# Altium schematic symbol library BARKO_SCHLIB.SchLib: 1064 symbols (part 1 of 11) (continued)
## C-47PF-0402 (continued)
CAP CER 47PF 50V C0G/NP0 0402; Manufacturer: Samsung; Manufacturer Part Number: CL05C470JB5NNNC; Material: Ceramic; Tolerance: 5%; Dielectric: C0G; Temperature Coefficient: 300ppm/°C; .Creator: F:TALI; .PCBCHK: USED; Washability: OK; Supplier 1: Digi-Key; Stock 1: 2062100; Pricing 1: 1 = 0.10000, 10 = 0.02300, 100 = 0.01050, 500 = 0.00748, 1000 = 0.00587, 2500 = 0.00534, 5000 = 0.00491 (USD); Mount: Surface Mount; Case Code (Metric): 1005; Case Code (Imperial): 0402; Contact Plating: Tin; Min Operating Temperature: -55°C; Max Operating Temperature: 125°C; Packaging: Tape and Reel; Package Quantity: 1; Capacitance: 47pF; Voltage Rating: 50V; Length: 1mm; Height: 0.5mm; Width: 0.02inch; Thickness: 0.022inch; Depth: 0.5mm; Radiation Hardening: No; ComponentLink1URL: http://www1.futureelectronics.com/doc/SAMSUNG%20PASSIVE/CL05B104KQ5NNNC.pdf?src-supplier=Future+Electronics; ComponentLink1Description: http://www1.futureelectronics.com/doc/SAMSUNG%20PASSIVE/CL05B104KQ5NNNC.pdf?src-supplier=Future+Electronics; ComponentLink2URL: https://www.verical.com/server-webapp/html/getDatasheet?partID=466159&src-supplier=Verical; ComponentLink2Description: https://www.verical.com/server-webapp/html/getDatasheet?partID=466159&src-supplier=Verical; ComponentLink3URL: https://produktinfo.conrad.com/datenblaetter/450000-474999/458555-da-01-en-VS_KONDENSATOR_0402.pdf?src-supplier=Conrad; ComponentLink3Description: https://produktinfo.conrad.com/datenblaetter/450000-474999/458555-da-01-en-VS_KONDENSATOR_0402.pdf?src-supplier=Conrad; ComponentLink4URL: http://datasheet.octopart.com/CL05C470JB5NNNC-Samsung-datasheet-8324245.pdf; ComponentLink4Description: http://datasheet.octopart.com/CL05C470JB5NNNC-Samsung-datasheet-8324245.pdf; ComponentLink5URL: http://datasheet.octopart.com/CL05C470JB5NNNC-Samsung-datasheet-8326407.pdf?src-supplier=TME; ComponentLink5Description: http://datasheet.octopart.com/CL05C470JB5NNNC-Samsung-datasheet-8326407.pdf?src-supplier=TME; ComponentLink6URL: http://datasheet.octopart.com/CL05C470JB5NNNC-Samsung-datasheet-26589092.pdf?src-supplier=Future+Electronics; ComponentLink6Description: http://datasheet.octopart.com/CL05C470JB5NNNC-Samsung-datasheet-26589092.pdf?src-supplier=Future+Electronics; ComponentLink7URL: http://datasheet.octopart.com/CL05C470JB5NNNC-Samsung-datasheet-37081328.pdf?src-supplier=Future+Electronics; ComponentLink7Description: http://datasheet.octopart.com/CL05C470JB5NNNC-Samsung-datasheet-37081328.pdf?src-supplier=Future+Electronics; ComponentLink8URL: http://datasheet.octopart.com/CL05C470JB5NNNC-Samsung-Electro-Mechanics-datasheet-81461755.pdf?src-supplier=Future+Electronics; ComponentLink8Description: http://datasheet.octopart.com/CL05C470JB5NNNC-Samsung-Electro-Mechanics-datasheet-81461755.pdf?src-supplier=Future+Electronics; ComponentLink9URL: http://datasheet.octopart.com/CL05C470JB5NNNC-Samsung-Electro-Mechanics-datasheet-110326809.pdf?src-supplier=Future+Electronics; ComponentLink9Description: http://datasheet.octopart.com/CL05C470JB5NNNC-Samsung-Electro-Mechanics-datasheet-110326809.pdf?src-supplier=Future+Electronics; ComponentLink10URL: http://datasheet.octopart.com/General-Multilayer-Ceramic-Capacitors-Samsung-datasheet-family-111.pdf; ComponentLink10Description: http://datasheet.octopart.com/General-Multilayer-Ceramic-Capacitors-Samsung-datasheet-family-111.pdf; Supplier Part Number 1: 1276-1699-1-ND; .SCHCHK: USED
footprint C-0402
pins: 1, 2

## C-47PF-0603
designator C?, comment 47PF  Voltage Rating: 50V  Case/Package: 0603
CAP CER 47PF 50V C0G/NP0 0603; Manufacturer: Samsung; Manufacturer Part Number: CL10C470JB8NNNC; Material: Ceramic; Tolerance: 5%; Dielectric: C0G; Temperature Coefficient: 300ppm/°C; Washability: OK; .Creator: M.OZKAN; .PCBCHK: USED; Supplier 1: Digi-Key; Stock 1: 211880; Pricing 1: 1=0.10000, 10=0.05600, 100=0.02510, 500=0.01792, 1000=0.01408 (USD); RoHS: Yes; Mount: Surface Mount; Case Code (Metric): 1608; Case Code (Imperial): 0603; Min Operating Temperature: -55°C; Max Operating Temperature: 125°C; Capacitance: 47pF; Voltage: 50V; Voltage Rating (DC): 50V; Package Quantity: 1; Packaging: Tape and Reel; Length: 1.6mm; Height: 0.8mm; Depth: 0.8mm; Width: 0.031inch; Thickness: 0.035inch; Radiation Hardening: No; Lead Free: Lead Free; ComponentLink1URL: https://datasheet.ciiva.com/25803/cl10c470jb8nnnc-25803543.pdf?src-supplier=Digi-Key; ComponentLink1Description: https://datasheet.ciiva.com/25803/cl10c470jb8nnnc-25803543.pdf?src-supplier=Digi-Key; ComponentLink2URL: https://datasheet.ciiva.com/26838/getdatasheetpartid-359564-26838540.pdf?src-supplier=Verical; ComponentLink2Description: https://datasheet.ciiva.com/26838/getdatasheetpartid-359564-26838540.pdf?src-supplier=Verical; ComponentLink3URL: https://datasheet.ciiva.com/29198/456890-da-01-en-vs-kondensator-0603-29198885.pdf?src-supplier=Conrad; ComponentLink3Description: https://datasheet.ciiva.com/29198/456890-da-01-en-vs-kondensator-0603-29198885.pdf?src-supplier=Conrad; ComponentLink4URL: https://datasheet.ciiva.com/26310/mlcc-catalogdownload2013-eng-26310294.pdf?src-supplier=Distrelec; ComponentLink4Description: https://datasheet.ciiva.com/26310/mlcc-catalogdownload2013-eng-26310294.pdf?src-supplier=Distrelec; Supplier Part Number 1: 1276-1037-1-ND; .SCHCHK: USED
footprint C-0603
pins: 1, 2

## C-68NF-1210
designator C?, comment 68NF  Voltage Rating: 630V  Case/Package: 1210
CAP CER 0.068UF 630V X7R 1210; Manufacturer: KEMET; Manufacturer Part Number: C1210C683KBRACAUTO; ComponentLink1URL: http://www.farnell.com/datasheets/2741232.pdf?src-supplier=Farnell; ComponentLink1Description: http://www.farnell.com/datasheets/2741232.pdf?src-supplier=Farnell; Supplier 1: Digi-Key; Supplier Part Number 1: 399-17164-1-ND; Stock: 2004; Pricing: 1=0.45, 10=0.32, 50=0.2422, 100=0.2109, 500=0.1562, 1000=0.1328 (USD); RoHS: No
footprint C-1210
pins: 1, 2

## C-68UF-RADIAL TH
designator C?, comment 68UF  Voltage Rating: 63V  Case/Package: Radial
CAP ALUM 68UF 20% 63V SMD; Manufacturer: Panasonic; Manufacturer Part Number: EEE-FK1J680UP; Ripple Current: 250mA; Impedance: 650mR; Life (Hours): 2000Hour; Leakage Current: 3uA; Lead Diameter: 0.9mm; Polarity: Polar; .PCBCHK: USED; .Creator: F:TALI; Washability: OK; Stock 1: 30080; Pricing 1: 1=0.75, 10=0.555, 100=0.3805 (USD); Mount: PCB,Surface Mount; Contact Plating: Tin; Min Operating Temperature: -55°C; Max Operating Temperature: 105°C; Capacitance: 68uF; Packaging: Tape and Reel; Tolerance: 20%; Ripple Current (AC): 250mA; Package Quantity: 1; Voltage Rating (DC): 63V; ESR (Equivalent Series Resistance): 650mR; Termination: SMD/SMT; Voltage: 63V; Diameter: 8mm; Length: 10.2mm; Height: 10.2mm; Lead Pitch: 3.1mm; Height - Seated (Max): 0.402inch; Width: 12mm; Radiation Hardening: No; REACH SVHC: No SVHC; Lead Free: Lead Free; ComponentLink1URL: http://uk.rs-online.com/webdocs/0e4e/0900766b80e4e8b0.pdf; ComponentLink1Description: http://uk.rs-online.com/webdocs/0e4e/0900766b80e4e8b0.pdf; ComponentLink2URL: http://industrial.panasonic.com/www-data/pdf/ABA0000/ABA0000CE120.pdf; ComponentLink2Description: http://industrial.panasonic.com/www-data/pdf/ABA0000/ABA0000CE120.pdf; ComponentLink3URL: http://www.farnell.com/datasheets/731857.pdf; ComponentLink3Description: http://www.farnell.com/datasheets/731857.pdf; ComponentLink4URL: http://www.farnell.com/datasheets/2002520.pdf; ComponentLink4Description: http://www.farnell.com/datasheets/2002520.pdf; ComponentLink5URL: https://www.alliedelec.com/m/d/e9dd47fa10a053d1f2828ce8bc944f54.pdf; ComponentLink5Description: https://www.alliedelec.com/m/d/e9dd47fa10a053d1f2828ce8bc944f54.pdf; ComponentLink6URL: http://www.farnell.com/datasheets/1676921.pdf; ComponentLink6Description: http://www.farnell.com/datasheets/1676921.pdf; ComponentLink7URL: http://www.farnell.com/datasheets/2245246.pdf; ComponentLink7Description: http://www.farnell.com/datasheets/2245246.pdf; ComponentLink8URL: https://www.distrelec.biz/Web/Downloads/_t/ds/PAN-FK_eng_tds.pdf?mime=application%2Fpdf; ComponentLink8Description: https://www.distrelec.biz/Web/Downloads/_t/ds/PAN-FK_eng_tds.pdf?mime=application%2Fpdf; Stock 2: 1080; Pricing 2: 1=0.9, 10=0.681, 100=0.4871 (USD); ComponentLink9URL: http://www.mouser.com/ds/2/315/ABA0000CE120-68386.pdf; ComponentLink9Description: http://www.mouser.com/ds/2/315/ABA0000CE120-68386.pdf; ComponentLink10URL: http://www.onlinecomponents.com/productFiles/mf-PSC/aba0000ce120.pdf; ComponentLink10Description: http://www.onlinecomponents.com/productFiles/mf-PSC/aba0000ce120.pdf; .SCHCHK: USED; Supplier 1: Digi-Key; Supplier Part Number 1: PCE4307CT-ND
pins: 1, 2
text: +

## C-100NF-0402
designator C?, comment 100NF  Voltage Rating: 16V  Case Code (Imperial): 0402
CAP CER 0.1UF 16V X7R 0402; Manufacturer: TDK; Manufacturer Part Number: CGA2B1X7R1C104K050BC; Tolerance: 10%; Material: Ceramic; .PCBCHK: USED; .Creator: F:TALI; Washability: OK; Stock 1: 0; Pricing 1: 1=0.1, 10=0.068, 100=0.0304, 500=0.02172, 1000=0.01706, 2500=0.01551, 5000=0.01427 (USD); Mount: Surface Mount; Case/Package: 0402; Weight: 2.3E-05oz; Case Code (Metric): 1005; Min Operating Temperature: -55°C; Max Operating Temperature: 125°C; Capacitance: 100nF; Voltage Rating (DC): 16V; Packaging: Tape and Reel; Dielectric: X7R; Termination: SMD/SMT; Package Quantity: 1; Composition: Ceramic; Length: 1mm; Height: 0.5mm; Depth: 0.5mm; Width: 0.5mm; Thickness: 0.022inch; Ratings: AEC-Q200; Lead Free: Lead Free; REACH SVHC: No SVHC; ComponentLink1URL: http://www.farnell.com/datasheets/1735392.pdf; ComponentLink1Description: http://www.farnell.com/datasheets/1735392.pdf; ComponentLink2URL: http://product.tdk.com/capacitor/mlcc/detailed_information.php?lang=en&amp;ref=jp&amp;part_no=CGA2B1X7R1C104K050BC; ComponentLink2Description: http://product.tdk.com/capacitor/mlcc/detailed_information.php?lang=en&amp;ref=jp&amp;part_no=CGA2B1X7R1C104K050BC; ComponentLink3URL: http://www.farnell.com/datasheets/1807242.pdf; ComponentLink3Description: http://www.farnell.com/datasheets/1807242.pdf; Stock 2: 100000; Pricing 2: 1=0.1, 10=0.03, 100=0.0134, 500=0.00958, 1000=0.00753, 2500=0.00684, 5000=0.0063 (USD); Contact Plating: Tin; Voltage: 16V; Radiation Hardening: No; ComponentLink4URL: http://www1.futureelectronics.com/doc/SAMSUNG%20PASSIVE/CL05B104KQ5NNNC.pdf; ComponentLink4Description: http://www1.futureelectronics.com/doc/SAMSUNG%20PASSIVE/CL05B104KQ5NNNC.pdf; ComponentLink5URL: https://www.verical.com/server-webapp/html/getDatasheet?partID=359683; ComponentLink5Description: https://www.verical.com/server-webapp/html/getDatasheet?partID=359683; ComponentLink6URL: https://www.distrelec.biz/Web/Downloads/_e/ng/MLCC_CatalogDownload2013_ENG.pdf?mime=application%2Fpdf; ComponentLink6Description: https://www.distrelec.biz/Web/Downloads/_e/ng/MLCC_CatalogDownload2013_ENG.pdf?mime=application%2Fpdf; ComponentLink7URL: https://produktinfo.conrad.com/datenblaetter/450000-474999/458718-da-01-en-VS_KONDENSATOR_0402.pdf; ComponentLink7Description: https://produktinfo.conrad.com/datenblaetter/450000-474999/458718-da-01-en-VS_KONDENSATOR_0402.pdf; Stock 3: 100000; Pricing 3: 1=0.1, 10=0.047, 100=0.0211, 500=0.01506, 1000=0.01183, 2500=0.01076, 5000=0.0099 (USD); Number of Pins: 2; Halogen Free: Halogen Free; ComponentLink8URL: http://www.yageo.com/documents/recent/UPY-GPHC_X7R_6.3V-to-50V_8.pdf; ComponentLink8Description: http://www.yageo.com/documents/recent/UPY-GPHC_X7R_6.3V-to-50V_8.pdf; ComponentLink9URL: http://www.yageo.com/documents/recent/UPY-GPHC_X7R_6.3V-to-50V_18.pdf; ComponentLink9Description: http://www.yageo.com/documents/recent/UPY-GPHC_X7R_6.3V-to-50V_18.pdf; ComponentLink10URL: http://www.farnell.com/datasheets/1734573.pdf; ComponentLink10Description: http://www.farnell.com/datasheets/1734573.pdf; ComponentLink11URL: http://www.farnell.com/datasheets/1489800.pdf; ComponentLink11Description: http://www.farnell.com/datasheets/1489800.pdf; .SCHCHK: USED; Supplier 1: Digi-Key; Supplier Part Number 1: 445-5613-6-ND
footprint C-0402
pins: 1, 2

## C-100NF-0402_1
designator C?, comment 100NF  Voltage Rating: 50V  Case Code (Imperial): 0402
CAP CER 0.1UF 50V X7R 0402; Manufacturer: TDK; Manufacturer Part Number: C1005X7R1H104K050BB; Dielectric Material: Ceramic; Tolerance: 10%; .PCBCHK: USED; .Creator: F:TALI; Washability: OK; Stock 1: 100000; Pricing 1: 1=0.13, 10=0.093, 100=0.0438, 500=0.0307, 1000=0.02541, 2500=0.02365, 5000=0.02163 (USD); Mount: Surface Mount; Case/Package: 0402; Weight: 2.3E-05oz; Case Code (Metric): 1005; Min Operating Temperature: -55°C; Max Operating Temperature: 125°C; Capacitance: 100nF; Dielectric: X7R; Packaging: Tape and Reel; Voltage Rating (DC): 50V; Termination: SMD/SMT; Voltage: 50V; Package Quantity: 1; Composition: Ceramic; Length: 1mm; Height: 0.5mm; Width: 0.5mm; Depth: 0.5mm; Thickness: 0.022inch; Radiation Hardening: No; Lead Free: Lead Free; REACH SVHC: No SVHC; ComponentLink1URL: https://product.tdk.com/info/en/documents/chara_sheet/C1005X7R1H104K050BB.pdf; ComponentLink1Description: https://product.tdk.com/info/en/documents/chara_sheet/C1005X7R1H104K050BB.pdf; ComponentLink2URL: http://www1.futureelectronics.com/doc/TDK/C1005X7R1H104K050BB.pdf; ComponentLink2Description: http://www1.futureelectronics.com/doc/TDK/C1005X7R1H104K050BB.pdf; ComponentLink3URL: http://www.farnell.com/datasheets/1913358.pdf; ComponentLink3Description: http://www.farnell.com/datasheets/1913358.pdf; ComponentLink4URL: http://www.tdk.co.jp/tefe02/e412_c.pdf; ComponentLink4Description: http://www.tdk.co.jp/tefe02/e412_c.pdf; ComponentLink5URL: http://www.farnell.com/datasheets/2291921.pdf; ComponentLink5Description: http://www.farnell.com/datasheets/2291921.pdf; Stock 2: 10000; Pricing 2: 1=0.17, 10=0.121, 100=0.0569, 500=0.03992, 1000=0.03305, 2500=0.03076, 5000=0.02814 (USD); Halogen Free: Halogen Free; ComponentLink6URL: http://ds.yuden.co.jp/TYCOMPAS/ut/detail.do?productNo=UMK105B7104KV-FR&fileName=UMK105B7104KV-FR_SS&mode=specSheetDownload; ComponentLink6Description: http://ds.yuden.co.jp/TYCOMPAS/ut/detail.do?productNo=UMK105B7104KV-FR&fileName=UMK105B7104KV-FR_SS&mode=specSheetDownload; ComponentLink7URL: http://www.onlinecomponents.com/productFiles/mf-TAI/619umk105b7104kv-fr.pdf; ComponentLink7Description: http://www.onlinecomponents.com/productFiles/mf-TAI/619umk105b7104kv-fr.pdf; Stock 3: 19730; Pricing 3: 1=0.24, 10=0.166, 100=0.0839, 500=0.0574, 1000=0.05078, 2500=0.04858, 5000=0.04416 (USD); Ratings: AEC-Q200; .SCHCHK: USED; Supplier 1: Digi-Key; Supplier Part Number 1: 445-5932-6-ND
footprint C-0402
pins: 1, 2

## C-100NF-0603
designator C?, comment 100NF  Voltage Rating: 50V  Case Code (Imperial): 0603
CAP CER 0.1UF 50V X7R 0603; Manufacturer: TDK; Manufacturer Part Number: C1608X7R1H104K080AA; Dielectric Material: Ceramic; Tolerance: 10%; Temperature Coefficient: 30ppm/°C; .PCBCHK: USED; .Creator: F:TALI; Washability: OK; Supplier 1: Digi-Key; Supplier Part Number 1: 445-1314-1-ND; Stock 1: 0; Pricing 1: 1=0.1, 10=0.057, 100=0.0254, 500=0.01812, 1000=0.01423 (USD); Mount: Surface Mount; Case/Package: 0603; Number of Pins: 2; Weight: 7.1E-05oz; Case Code (Metric): 1608; Min Operating Temperature: -55°C; Max Operating Temperature: 125°C; Capacitance: 100nF; Dielectric: X7R; Packaging: Tape and Reel; Package Quantity: 1; Termination: SMD/SMT; Voltage: 50V; Voltage Rating (DC): 50V; Composition: Ceramic; Length: 1.6mm; Height: 0.8mm; Depth: 0.8mm; Width: 0.8mm; Thickness: 0.037inch; Radiation Hardening: No; REACH SVHC: No SVHC; Lead Free: Lead Free; ComponentLink1URL: http://www.mouser.com/ds/2/400/lcc_commercial_general_en-837201.pdf; ComponentLink1Description: http://www.mouser.com/ds/2/400/lcc_commercial_general_en-837201.pdf; ComponentLink2URL: https://product.tdk.com/info/en/catalog/spec/mlccspec_commercial_general_midvoltage_en.pdf; ComponentLink2Description: https://product.tdk.com/info/en/catalog/spec/mlccspec_commercial_general_midvoltage_en.pdf; ComponentLink3URL: http://uk.rs-online.com/webdocs/13d1/0900766b813d1103.pdf; ComponentLink3Description: http://uk.rs-online.com/webdocs/13d1/0900766b813d1103.pdf; ComponentLink4URL: http://www.tdk.co.jp/tefe02/e412_c.pdf; ComponentLink4Description: http://www.tdk.co.jp/tefe02/e412_c.pdf; ComponentLink5URL: http://www.farnell.com/datasheets/2291921.pdf; ComponentLink5Description: http://www.farnell.com/datasheets/2291921.pdf; ComponentLink6URL: http://www.farnell.com/datasheets/1744655.pdf; ComponentLink6Description: http://www.farnell.com/datasheets/1744655.pdf; Supplier 2: Digi-Key; Supplier Part Number 2: 478-3540-6-ND; Stock 2: 40000; Pricing 2: 1=0.23, 10=0.161, 100=0.0756, 500=0.05304, 1000=0.0439 (USD); Contact Plating: Matte,Tin; Features: Soft Termination; ComponentLink7URL: http://catalogs.avx.com/SurfaceMount.pdf; ComponentLink7Description: http://catalogs.avx.com/SurfaceMount.pdf; ComponentLink8URL: http://www.farnell.com/datasheets/630895.pdf; ComponentLink8Description: http://www.farnell.com/datasheets/630895.pdf; ComponentLink9URL: http://www.avx.com/docs/Catalogs/cx7r.pdf; ComponentLink9Description: http://www.avx.com/docs/Catalogs/cx7r.pdf; ComponentLink10URL: http://www.avx.com/docs/catalogs/cauto.pdf; ComponentLink10Description: http://www.avx.com/docs/catalogs/cauto.pdf; ComponentLink11URL: https://www.verical.com/server-webapp/html/getDatasheet?partID=98691; ComponentLink11Description: https://www.verical.com/server-webapp/html/getDatasheet?partID=98691; ComponentLink12URL: https://www.avx.com/docs/Catalogs/flexiterm.pdf; ComponentLink12Description: https://www.avx.com/docs/Catalogs/flexiterm.pdf; .SCHCHK: USED
footprint C-0603
pins: 1, 2

## C-100NF-0603_1
designator C?, comment 100NF  Voltage Rating: 50V  Case/Package: 0603
CAP CER 0.1UF 50V Y5V 0603; Manufacturer: Yageo; Manufacturer Part Number: CC0603ZRY5V9BB104; Tolerance: 80%; Dielectric Material: Tantalum; .PCBCHK: USED; .Creator: F:TALI; Washability: OK; Supplier 1: Digi-Key; Supplier Part Number 1: 311-1343-6-ND; Stock 1: 40000; Pricing 1: 1=0.13, 10=0.093, 100=0.0413, 500=0.02952, 1000=0.0232 (USD); Mount: Surface Mount; Number of Pins: 2; Case Code (Metric): 1608; Case Code (Imperial): 0603; Min Operating Temperature: -30°C; Max Operating Temperature: 85°C; Capacitance: 100nF; Package Quantity: 1; Packaging: Tape and Reel; Voltage Rating (DC): 50V; Dielectric: Y5V; Termination: SMD/SMT; Composition: Ceramic; Voltage: 50V; Length: 1.6mm; Height: 0.8mm; Width: 0.031inch; Thickness: 0.035inch; Depth: 0.8mm; Radiation Hardening: No; REACH SVHC: No SVHC; Lead Free: Lead Free; Halogen Free: Halogen Free; ComponentLink1URL: http://www.yageo.com/documents/recent/UPY-GPHC_Y5V_6.3V-to-50V_8.pdf; ComponentLink1Description: http://www.yageo.com/documents/recent/UPY-GPHC_Y5V_6.3V-to-50V_8.pdf; ComponentLink2URL: http://www.yageo.com/documents/recent/UPY-GPHC_Y5V_6.3V-to-50V_5.pdf; ComponentLink2Description: http://www.yageo.com/documents/recent/UPY-GPHC_Y5V_6.3V-to-50V_5.pdf; ComponentLink3URL: https://www.verical.com/server-webapp/html/getDatasheet?partID=403611; ComponentLink3Description: https://www.verical.com/server-webapp/html/getDatasheet?partID=403611; ComponentLink4URL: http://www.mouser.com/ds/2/447/Yageo_UPY-GP_NP0_16V-to-50V_9-358835.pdf; ComponentLink4Description: http://www.mouser.com/ds/2/447/Yageo_UPY-GP_NP0_16V-to-50V_9-358835.pdf; ComponentLink5URL: http://www.farnell.com/datasheets/1132289.pdf; ComponentLink5Description: http://www.farnell.com/datasheets/1132289.pdf; Supplier 2: Digi-Key; Supplier Part Number 2: 720-1671-6-ND; Stock 2: 11345; Pricing 2: 1=0.23, 10=0.161, 100=0.0757, 500=0.05308, 1000=0.04394 (USD); ComponentLink6URL: http://www.vishay.com/docs/28548/vjw1bcbascomseries.pdf; ComponentLink6Description: http://www.vishay.com/docs/28548/vjw1bcbascomseries.pdf; Supplier 3: Digi-Key; Supplier Part Number 3: 478-3724-6-ND; Stock 3: 40000; Pricing 3: 1=0.11, 10=0.079, 100=0.0352, 500=0.02516, 1000=0.01977 (USD); Contact Plating: Matte,Tin; ComponentLink7URL: http://www.avx.com/docs/Catalogs/cy5v.pdf; ComponentLink7Description: http://www.avx.com/docs/Catalogs/cy5v.pdf; ComponentLink8URL: http://www.farnell.com/datasheets/578190.pdf; ComponentLink8Description: http://www.farnell.com/datasheets/578190.pdf; ComponentLink9URL: http://catalogs.avx.com/SurfaceMount.pdf; ComponentLink9Description: http://catalogs.avx.com/SurfaceMount.pdf; .SCHCHK: USED
footprint C-0603
pins: 1, 2

## C-100NF-0805
designator C?, comment 100NF  Voltage Rating: 50V  Case Code (Imperial): 0805
CAP CER 0.1UF 50V 10% X7R 0805; Manufacturer: TDK; Manufacturer Part Number: CGA4J2X7R1H104K125AE; Dielectric Material: Ceramic; Dissipation Factor: 2.5%; Insulation Resistance: 100GR; .PCBCHK: USED; .Creator: F:TALI; Washability: OK; Mount: Surface Mount; Case/Package: 0805; Case Code (Metric): 2012; Min Operating Temperature: -55°C; Max Operating Temperature: 125°C; Package Quantity: 1; Packaging: Tape and Reel; Tolerance: 10%; Features: Soft Termination; Length: 0.079inch; Width: 0.049inch; Thickness: 0.057inch; Ratings: AEC-Q200; Lead Free: Lead Free; Capacitance: 100nF; Supplier 1: Digi-Key; Supplier Part Number 1: 587-1279-6-ND; Stock 1: 3000; Pricing 1: 1=0.15, 10=0.108, 100=0.0507, 500=0.03554, 1000=0.02942 (USD); Contact Plating: Nickel; Voltage Rating (DC): 50V; Dielectric: X7R; Termination: SMD/SMT; Voltage: 50V; Height: 1.25mm; Depth: 1.25mm; REACH SVHC: Unknown; Halogen Free: Halogen Free; ComponentLink1URL: https://www.yuden.co.jp/productdata/catalog/mlcc_all_e.pdf; ComponentLink1Description: https://www.yuden.co.jp/productdata/catalog/mlcc_all_e.pdf; ComponentLink2URL: http://www.farnell.com/datasheets/746258.pdf; ComponentLink2Description: http://www.farnell.com/datasheets/746258.pdf; Supplier 2: Digi-Key; Supplier Part Number 2: 478-10836-6-ND; Stock 2: 150000; Pricing 2: 1=0.22, 10=0.16, 100=0.075, 500=0.05262, 1000=0.04356, 2500=0.04054, 5000=0.03709 (USD); Number of Pins: 2; Radiation Hardening: No; ComponentLink3URL: http://www.avx.com/docs/catalogs/cx7r.pdf; ComponentLink3Description: http://www.avx.com/docs/catalogs/cx7r.pdf; ComponentLink4URL: http://www.farnell.com/datasheets/1679506.pdf; ComponentLink4Description: http://www.farnell.com/datasheets/1679506.pdf; ComponentLink5URL: http://www.mouser.com/ds/2/40/X7RDielectric-777024.pdf; ComponentLink5Description: http://www.mouser.com/ds/2/40/X7RDielectric-777024.pdf; Supplier 3: Digi-Key; Supplier Part Number 3: 311-1140-6-ND; Stock 3: 0; Pricing 3: 1=0.2, 10=0.139, 100=0.0655, 500=0.04596, 1000=0.03804 (USD); Material: Ceramic; ComponentLink6URL: http://www.yageo.com/documents/recent/UPY-GPHC_X7R_6.3V-to-50V_8.pdf; ComponentLink6Description: http://www.yageo.com/documents/recent/UPY-GPHC_X7R_6.3V-to-50V_8.pdf; ComponentLink7URL: http://www.farnell.com/datasheets/1489800.pdf; ComponentLink7Description: http://www.farnell.com/datasheets/1489800.pdf; ComponentLink8URL: http://www.yageo.com/documents/recent/UPY-GPHC_X7R_6.3V-to-50V_18.pdf; ComponentLink8Description: http://www.yageo.com/documents/recent/UPY-GPHC_X7R_6.3V-to-50V_18.pdf; ComponentLink9URL: http://www.farnell.com/datasheets/1734573.pdf; ComponentLink9Description: http://www.farnell.com/datasheets/1734573.pdf; ComponentLink10URL: http://www.produktinfo.conrad.com/datenblaetter/425000-449999/445210-da-01-en-KERKO_CHIP_0805_X7R_0_1uF_10Proz_50VG.pdf; ComponentLink10Description: http://www.produktinfo.conrad.com/datenblaetter/425000-449999/445210-da-01-en-KERKO_CHIP_0805_X7R_0_1uF_10Proz_50VG.pdf; .SCHCHK: USED
footprint C-0805
pins: 1, 2

## C-100nF-0805-100V
designator C?, comment 100nF  Voltage Rating: 100V  Case/Package: 0805
CAP CER 0.1UF 100V X7R 0805; Manufacturer: Samsung; Manufacturer Part Number: CL21B104KCFNNNE; Tolerance: 10%; Supplier 1: Digi-Key; Supplier Part Number 1: 1276-6840-1-ND; Stock: 963388; Pricing: 1=0.1, 10=0.054, 50=0.0294, 100=0.0239, 500=0.0171, 1000=0.0134 (USD); RoHS: Yes; Mount: Surface Mount; Case Code (Metric): 2012; Case Code (Imperial): 0805; Min Operating Temperature: -55°C; Max Operating Temperature: 125°C; Dielectric: X7R; Packaging: Tape and Reel; Capacitance: 100nF; Length: 2mm; Width: 0.049inch; Thickness: 0.053inch; Depth: 1.25mm; Radiation Hardening: No; ComponentLink1URL: https://datasheet.ciiva.com/26936/getdatasheetpartid-781823-26936904.pdf?src-supplier=Verical; ComponentLink1Description: https://datasheet.ciiva.com/26936/getdatasheetpartid-781823-26936904.pdf?src-supplier=Verical
footprint C-0805
pins: 1, 2

## C-100NF-0805_1
designator C?, comment 100NF  Case/Package: 0805  Voltage Rating: 50V
CAP CER 0.1UF 50V Y5V 0805; Manufacturer: Samsung; Manufacturer Part Number: CL21F104ZBCNNND; Tolerance: 80%; Material: Ceramic; Dissipation Factor: 7%; .PCBCHK: USED; .Creator: F:TALI; Washability: OK; Supplier 1: Digi-Key; Supplier Part Number 1: CL21F104ZBCNNND-ND; Stock 1: 0; Pricing 1: 100000=0.00495 (USD); Mount: Surface Mount; Min Operating Temperature: -30°C; Max Operating Temperature: 85°C; Capacitance: 100nF; Dielectric: Y5V; Packaging: Tape and Reel; Package Quantity: 10000; Voltage: 50V; Voltage Rating (DC): 50V; Length: 2mm; Height: 0.85mm; Depth: 1.25mm; Width: 0.049inch; Thickness: 0.037inch; Radiation Hardening: No; Lead Free: Lead Free; ComponentLink1URL: http://www1.futureelectronics.com/doc/SAMSUNG/CLSERIES.pdf; ComponentLink1Description: http://www1.futureelectronics.com/doc/SAMSUNG/CLSERIES.pdf; ComponentLink2URL: http://www.samsungsem.com/kr/support/product-search/mlcc/CL21F104ZBCNNND.jsp; ComponentLink2Description: http://www.samsungsem.com/kr/support/product-search/mlcc/CL21F104ZBCNNND.jsp; ComponentLink3URL: https://www.verical.com/server-webapp/html/getDatasheet?partID=354013; ComponentLink3Description: https://www.verical.com/server-webapp/html/getDatasheet?partID=354013; Supplier 2: Digi-Key; Supplier Part Number 2: 1276-1007-6-ND; Stock 2: 40000; Pricing 2: 1=0.1, 10=0.046, 100=0.0203, 500=0.01448, 1000=0.01138 (USD); Case Code (Metric): 2012; Case Code (Imperial): 0805; ComponentLink4URL: https://www.verical.com/server-webapp/html/getDatasheet?partID=466953; ComponentLink4Description: https://www.verical.com/server-webapp/html/getDatasheet?partID=466953; ComponentLink5URL: https://produktinfo.conrad.com/datenblaetter/450000-474999/454191-da-01-en-VS_KONDENSATOR_0805.pdf; ComponentLink5Description: https://produktinfo.conrad.com/datenblaetter/450000-474999/454191-da-01-en-VS_KONDENSATOR_0805.pdf; Supplier 3: Digi-Key; Supplier Part Number 3: 399-9158-6-ND; Stock 3: 40000; Pricing 3: 1=0.11, 10=0.081, 100=0.036, 500=0.02568, 1000=0.02018 (USD); Dielectric Material: Ceramic; Termination: SMD/SMT; Lead Pitch: 0.75mm; REACH SVHC: No SVHC; .SCHCHK: USED
footprint C-0805
pins: 1, 2

## C-100PF-0402
designator C?, comment 100PF  Voltage Rating: 50V  Case/Package: 0402
CAP CER 100PF 50V C0G/NP0 0402; Manufacturer: Kyocera AVX; Manufacturer Part Number: 04025A101FAT2A; Dielectric Material: Ceramic; Tolerance: 1%; Dielectric: C0G; .PCBCHK: CHECKED; .Creator: M.OZKAN; Washability: OK; Supplier 1: Digi-Key; Supplier Part Number 1: 478-3658-6-ND; Stock 1: 100000; Pricing 1: 1=0.22, 10=0.151, 100=0.0765, 500=0.05232, 1000=0.04629, 2500=0.04428, 5000=0.04025 (USD); Mount: PCB,Surface Mount; Number of Pins: 2; Case Code (Metric): 1005; Case Code (Imperial): 0402; Min Operating Temperature: -55°C; Max Operating Temperature: 125°C; Capacitance: 100pF; Package Quantity: 1; Packaging: Tape and Reel; Voltage Rating (DC): 50V; Termination: SMD/SMT; Voltage: 50V; Length: 1mm; Height: 0.56mm; Width: 0.02inch; Thickness: 0.022inch; Depth: 0.5mm; Radiation Hardening: No; REACH SVHC: No SVHC; Lead Free: Lead Free; ComponentLink1URL: http://www.farnell.com/datasheets/759117.pdf; ComponentLink1Description: http://www.farnell.com/datasheets/759117.pdf; ComponentLink2URL: https://www.alliedelec.com/m/d/5af77e5339fff8f6eaeadc15d0e28f67.pdf; ComponentLink2Description: https://www.alliedelec.com/m/d/5af77e5339fff8f6eaeadc15d0e28f67.pdf; ComponentLink3URL: http://www.farnell.com/datasheets/1796416.pdf; ComponentLink3Description: http://www.farnell.com/datasheets/1796416.pdf; ComponentLink4URL: http://www.mouser.com/ds/2/40/C0GNP0-Dielectric-951274.pdf; ComponentLink4Description: http://www.mouser.com/ds/2/40/C0GNP0-Dielectric-951274.pdf; ComponentLink5URL: http://www.avxcorp.com/docs/Catalogs/ccog.pdf; ComponentLink5Description: http://www.avxcorp.com/docs/Catalogs/ccog.pdf; ComponentLink6URL: https://www.verical.com/server-webapp/html/getDatasheet?partID=728643; ComponentLink6Description: https://www.verical.com/server-webapp/html/getDatasheet?partID=728643; ComponentLink7URL: http://catalogs.avx.com/SurfaceMount.pdf; ComponentLink7Description: http://catalogs.avx.com/SurfaceMount.pdf; ComponentLink8URL: http://www.farnell.com/datasheets/84496.pdf; ComponentLink8Description: http://www.farnell.com/datasheets/84496.pdf; Supplier 2: Digi-Key; Supplier Part Number 2: 311-3329-6-ND; Stock 2: 0; Pricing 2: 1=0.13, 10=0.096, 100=0.045, 500=0.03152, 1000=0.0261, 2500=0.02429, 5000=0.02222 (USD); Composition: Ceramic; Supplier 3: Digi-Key; Supplier Part Number 3: 490-7753-6-ND; Stock 3: 129185; Pricing 3: 1=0.11, 10=0.084, 100=0.0374, 500=0.02668, 1000=0.02097, 2500=0.01906, 5000=0.01754 (USD); ComponentLink9URL: http://search.murata.co.jp/Ceramy/image/img/A01X/G101/ENG/GRM1555C1H101FA01-01.pdf; ComponentLink9Description: http://search.murata.co.jp/Ceramy/image/img/A01X/G101/ENG/GRM1555C1H101FA01-01.pdf; .SCHCHK: CHECKED
footprint C-0402
pins: 1, 2

## C-100PF-0603
designator C?, comment 100PF  Voltage Rating: 100V  Case/Package: 0603
CAP CER 100PF 100V NP0 0603; Manufacturer: Kyocera AVX; Manufacturer Part Number: 06031A101KAT2A; Dielectric Material: Ceramic; Tolerance: 10%; Dielectric: C0G; Dissipation Factor: 0.5%; .PCBCHK: CHECKED; .Creator: M.OZKAN; Washability: OK; Supplier 1: Digi-Key; Supplier Part Number 1: 478-3672-1-ND; Stock 1: 0; Pricing 1: 1=0.21, 10=0.15, 100=0.0706, 500=0.04952, 1000=0.041 (USD); Mount: PCB,Surface Mount; Number of Pins: 2; Case Code (Metric): 1608; Min Operating Temperature: -55°C; Max Operating Temperature: 125°C; Packaging: Tape and Reel; Package Quantity: 1; Voltage Rating (DC): 100V; Termination: SMD/SMT; Voltage: 100V; Length: 1.6mm; Height: 0.9mm; Width: 0.032inch; Thickness: 0.035inch; Depth: 0.81mm; Radiation Hardening: No; REACH SVHC: No SVHC; Lead Free: Lead Free; ComponentLink1URL: http://datasheets.avx.com/C0GNP0-Dielectric.pdf; ComponentLink1Description: http://datasheets.avx.com/C0GNP0-Dielectric.pdf; ComponentLink2URL: http://catalogs.avx.com/SurfaceMount.pdf; ComponentLink2Description: http://catalogs.avx.com/SurfaceMount.pdf; ComponentLink3URL: http://www.avx.com/docs/Catalogs/ccog.pdf; ComponentLink3Description: http://www.avx.com/docs/Catalogs/ccog.pdf; ComponentLink4URL: http://www.farnell.com/datasheets/1796416.pdf; ComponentLink4Description: http://www.farnell.com/datasheets/1796416.pdf; ComponentLink5URL: http://www.avxcorp.com/docs/Catalogs/ccog.pdf; ComponentLink5Description: http://www.avxcorp.com/docs/Catalogs/ccog.pdf; Capacitance: 100pF; Case Code (Imperial): 0603; Supplier 2: Digi-Key; Supplier Part Number 2: 399-7822-6-ND; Stock 2: 8; Pricing 2: 1=0.36, 10=0.248, 100=0.1408, 500=0.09936, 1000=0.08694 (USD); Lead Pitch: 0.7mm; Supplier 3: Digi-Key; Supplier Part Number 3: 478-9853-6-ND; Stock 3: 0; Pricing 3: 1=0.33, 10=0.222, 100=0.1125, 500=0.077, 1000=0.06811 (USD); Ratings: AEC-Q200; ComponentLink6URL: http://www.avx.com/docs/Catalogs/cauto.pdf; ComponentLink6Description: http://www.avx.com/docs/Catalogs/cauto.pdf; .SCHCHK: CHECKED
footprint C-0603
pins: 1, 2

## C-100PF-0603_1
designator C?, comment 100PF  Voltage Rating: 50V  Case/Package: 0603
CAP CER 100PF 50V C0G/NP0 0603; Manufacturer: Samsung; Manufacturer Part Number: CL10C101JB8NNNC; Material: Ceramic; Tolerance: 5%; Dielectric: C0G; Temperature Coefficient: 300ppm/°C; Insulation Resistance: 100GR; .PCBCHK: CHECKED; .Creator: M.OZKAN; Washability: OK; Supplier 1: Digi-Key; Supplier Part Number 1: 1276-1008-6-ND; Stock 1: 0; Pricing 1: 1=0.1, 10=0.042, 100=0.0189, 500=0.01348, 1000=0.01059 (USD); Mount: Surface Mount; Case Code (Metric): 1608; Case Code (Imperial): 0603; Contact Plating: Tin; Min Operating Temperature: -55°C; Max Operating Temperature: 125°C; Capacitance: 100pF; Voltage Rating (DC): 50V; Packaging: Tape and Reel; Package Quantity: 1; Length: 1.6mm; Height: 0.8mm; Depth: 0.8mm; Width: 0.031inch; Thickness: 0.035inch; Radiation Hardening: No; Lead Free: Lead Free; ComponentLink1URL: https://media.digikey.com/pdf/Data%20Sheets/Samsung%20PDFs/CL_Series_MLCC_ds.pdf; ComponentLink1Description: https://media.digikey.com/pdf/Data%20Sheets/Samsung%20PDFs/CL_Series_MLCC_ds.pdf; ComponentLink2URL: https://www.verical.com/server-webapp/html/getDatasheet?partID=358356; ComponentLink2Description: https://www.verical.com/server-webapp/html/getDatasheet?partID=358356; ComponentLink3URL: https://www.distrelec.biz/Web/Downloads/_e/ng/MLCC_CatalogDownload2013_ENG.pdf?mime=application%2Fpdf; ComponentLink3Description: https://www.distrelec.biz/Web/Downloads/_e/ng/MLCC_CatalogDownload2013_ENG.pdf?mime=application%2Fpdf; ComponentLink4URL: https://produktinfo.conrad.com/datenblaetter/450000-474999/456574-da-01-en-VS_KONDENSATOR_0603.pdf; ComponentLink4Description: https://produktinfo.conrad.com/datenblaetter/450000-474999/456574-da-01-en-VS_KONDENSATOR_0603.pdf; Voltage: 50V; Supplier 2: Digi-Key; Supplier Part Number 2: 311-1069-6-ND; Stock 2: 40000; Pricing 2: 1=0.1, 10=0.076, 100=0.0338, 500=0.02412, 1000=0.01895 (USD); Number of Pins: 2; Termination: SMD/SMT; Composition: Ceramic; REACH SVHC: Unknown; ComponentLink5URL: http://www.yageo.com/documents/recent/UPY-GP_NP0_16V-to-50V_16.pdf; ComponentLink5Description: http://www.yageo.com/documents/recent/UPY-GP_NP0_16V-to-50V_16.pdf; ComponentLink6URL: http://www.yageo.com/documents/recent/UPY-GP_NP0_16V-to-50V_8.pdf; ComponentLink6Description: http://www.yageo.com/documents/recent/UPY-GP_NP0_16V-to-50V_8.pdf; ComponentLink7URL: http://www.farnell.com/datasheets/1835847.pdf; ComponentLink7Description: http://www.farnell.com/datasheets/1835847.pdf; ComponentLink8URL: http://www.farnell.com/datasheets/1443161.pdf; ComponentLink8Description: http://www.farnell.com/datasheets/1443161.pdf; ComponentLink9URL: https://www.verical.com/server-webapp/html/getDatasheet?partID=403525; ComponentLink9Description: https://www.verical.com/server-webapp/html/getDatasheet?partID=403525; Supplier 3: Digi-Key; Supplier Part Number 3: 490-1427-6-ND; Stock 3: 40000; Pricing 3: 1=0.14, 10=0.101, 100=0.0451, 500=0.0322, 1000=0.0253 (USD); Weight: 7.1E-05oz; Dielectric Material: Ceramic; ComponentLink10URL: https://www.murata.com/~/media/webrenewal/support/library/catalog/products/capacitor/mlcc/c02e.ashx?la=en-us; ComponentLink10Description: https://www.murata.com/~/media/webrenewal/support/library/catalog/products/capacitor/mlcc/c02e.ashx?la=en-us; ComponentLink11URL: http://components.arrow.com/part/dataview/5428837S2959114N2606; ComponentLink11Description: http://components.arrow.com/part/dataview/5428837S2959114N2606; ComponentLink12URL: https://www.verical.com/server-webapp/html/getDatasheet?partID=26823; ComponentLink12Description: https://www.verical.com/server-webapp/html/getDatasheet?partID=26823; ComponentLink13URL: http://www.murata.com/products/catalog/pdf/c02e.pdf; ComponentLink13Description: http://www.murata.com/products/catalog/pdf/c02e.pdf; ComponentLink14URL: http://www.farnell.com/datasheets/4360.pdf; ComponentLink14Description: http://www.farnell.com/datasheets/4360.pdf; ComponentLink15URL: http://www.farnell.com/datasheets/2047901.pdf; ComponentLink15Description: http://www.farnell.com/datasheets/2047901.pdf; ComponentLink16URL: https://www.distrelec.biz/Web/Downloads/_t/ds/murata_MLCC_eng_tds.pdf?mime=application%2Fpdf; ComponentLink16Description: https://www.distrelec.biz/Web/Downloads/_t/ds/murata_MLCC_eng_tds.pdf?mime=application%2Fpdf; ComponentLink17URL: http://psearch.murata.com/capacitor/product/GRM1885C1H101JA01%23.pdf; ComponentLink17Description: http://psearch.murata.com/capacitor/product/GRM1885C1H101JA01%23.pdf; ComponentLink18URL: https://produktinfo.conrad.com/datenblaetter/450000-474999/450134-da-01-en-VS_KONDENSATOR_0603.pdf; ComponentLink18Description: https://produktinfo.conrad.com/datenblaetter/450000-474999/450134-da-01-en-VS_KONDENSATOR_0603.pdf; .SCHCHK: CHECKED
footprint C-0603
pins: 1, 2

## C-100PF-0805
designator C?, comment 100PF  Voltage Rating: 450V  Case/Package: 0805
CAP CER 100PF 450V 5% C0G 0805; Manufacturer: TDK; Manufacturer Part Number: C2012C0G2W101J060AA; .PCBCHK: CHECKED; .Creator: M.OZKAN; Washability: OK; Supplier 1: Digi-Key; Supplier Part Number 1: 445-15297-6-ND; Stock 1: 4323; Pricing 1: 1=0.27, 10=0.183, 100=0.0929, 500=0.06354, 1000=0.05621 (USD); Mount: Surface Mount; Case Code (Metric): 2012; Min Operating Temperature: -55°C; Max Operating Temperature: 125°C; Package Quantity: 4000; Packaging: Tape and Reel; Capacitance: 100pF; Tolerance: 5%; Voltage Rating (DC): 450V; Dielectric: C0G; Termination: SMD/SMT; Length: 0.079inch; Height: 0.6mm; Width: 0.049inch; Thickness: 0.03inch; Lead Free: Lead Free; Case Code (Imperial): 0805; Supplier 2: Digikey; Supplier Part Number 2: 445-180294-6-ND; Stock 2: 11990; Pricing 2: 1=0.3, 10=0.207, 100=0.1049, 500=0.07176, 1000=0.06348 (USD); Supplier 3: Digikey; Supplier Part Number 3: 445-175678-6-ND; Stock 3: 7355; Pricing 3: 1=0.32, 10=0.217, 100=0.1101, 500=0.07534, 1000=0.06665 (USD); .SCHCHK: CHECKED
footprint C-0805
pins: 1, 2

## C-100PF-0805_1
designator C?, comment 100PF  Voltage Rating: 50V  Case/Package: 0805
CAP CER 100PF 50V X7R 0805; Manufacturer: KEMET; Manufacturer Part Number: C0805C101K5RAC7800; Dielectric Material: Ceramic; Tolerance: 10%; Dissipation Factor: 2.5%; Insulation Resistance: 100GR; .PCBCHK: CHECKED; .Creator: M.OZKAN; Washability: OK; Supplier 1: Digi-Key; Supplier Part Number 1: 399-7981-6-ND; Stock 1: 975; Pricing 1: 1=0.3, 10=0.205, 100=0.1163, 500=0.08212, 1000=0.07185 (USD); Min Operating Temperature: -55°C; Max Operating Temperature: 125°C; Capacitance: 100pF; Packaging: Tape and Reel; Dielectric: X7R; Length: 2mm; Depth: 1.25mm; Radiation Hardening: No; ComponentLink1URL: https://www.verical.com/server-webapp/html/getDatasheet?partID=508685; ComponentLink1Description: https://www.verical.com/server-webapp/html/getDatasheet?partID=508685; Supplier 2: Digi-Key; Supplier Part Number 2: 478-11898-6-ND; Stock 2: 0; Pricing 2: 1=0.33, 10=0.226, 100=0.1147, 500=0.07848, 1000=0.06943 (USD); Mount: Surface Mount; Number of Pins: 2; Case Code (Metric): 2012; Case Code (Imperial): 0805; Package Quantity: 4000; Voltage Rating (DC): 50V; Termination: SMD/SMT; Voltage: 50V; Width: 0.049inch; Thickness: 0.037inch; REACH SVHC: No SVHC; Lead Free: Lead Free; ComponentLink2URL: http://datasheets.avx.com/X7RDielectric.pdf; ComponentLink2Description: http://datasheets.avx.com/X7RDielectric.pdf; ComponentLink3URL: http://www.farnell.com/datasheets/1679506.pdf; ComponentLink3Description: http://www.farnell.com/datasheets/1679506.pdf; ComponentLink4URL: http://www.mouser.com/ds/2/40/X7RDielectric-777024.pdf; ComponentLink4Description: http://www.mouser.com/ds/2/40/X7RDielectric-777024.pdf; Supplier 3: Digi-Key; Supplier Part Number 3: 311-3603-6-ND; Stock 3: 0; Pricing 3: 1=0.16, 10=0.111, 100=0.0521, 500=0.03652, 1000=0.03023 (USD); Weight: 0.000194oz; Composition: Ceramic; Halogen Free: Halogen Free; ComponentLink5URL: http://www.yageo.com/documents/recent/UPY-GPHC_X7R_6.3V-to-50V_8.pdf; ComponentLink5Description: http://www.yageo.com/documents/recent/UPY-GPHC_X7R_6.3V-to-50V_8.pdf; .SCHCHK: CHECKED
footprint C-0805
pins: 1, 2

## C-100U-SMD-10.3X10.3
designator C?, comment 100U  Case/Package: Radial  Voltage Rating: 50V
CAP ALUM POLY 100UF 20% 50V SMD; Manufacturer: Panasonic; Manufacturer Part Number: EEHZA1H101V; ESR (Equivalent Series Resistance): 28mR; Life (Hours): 10000Hour; Washability: OK; .Creator: M.OZKAN; .PCBCHK: USED; ComponentLink1URL: http://www.farnell.com/datasheets/2368699.pdf?src-supplier=Farnell; ComponentLink1Description: http://www.farnell.com/datasheets/2368699.pdf?src-supplier=Farnell; ComponentLink2URL: http://nichicon-us.com/english/products/pdfs/e-gya.pdf?src-supplier=Digi-Key; ComponentLink2Description: http://nichicon-us.com/english/products/pdfs/e-gya.pdf?src-supplier=Digi-Key; Supplier 1: Digi-Key; Supplier Part Number 1: P19827CT-ND; Stock 1: 4062; Pricing 1: 1=2.22000, 10=1.79500, 100=1.37050 (USD); RoHS: Yes; Mount: Surface Mount; Min Operating Temperature: -55°C; Max Operating Temperature: 105°C; Composition: Hybrid; Packaging: Tape and Reel; Capacitance: 100uF; Tolerance: 20%; Ratings: AEC-Q200; ComponentLink3URL: https://industrial.panasonic.com/cdbs/www-data/pdf/RDD0000/ABA0000C1221.pdf?src-supplier=Digi-Key; ComponentLink3Description: https://industrial.panasonic.com/cdbs/www-data/pdf/RDD0000/ABA0000C1221.pdf?src-supplier=Digi-Key; .SCHCHK: USED
footprint C-E-10.3x10.3x10.5
pins: 1, 2
text: +

## C-100uF-100V
designator C?, comment 100uF  Case/Package: Radial  Voltage Rating (DC): 100V